# Altium footprint library THU VIEN PCB.PCBLib: 911 footprints (part 39 of 57)
Each footprint in its own frame and in the unit in brackets; x right, y up, seen from the top. Pads: shape width x height; smd on the part's side, far side on the other; paste and mask are expansions set on the pad; w line width, h text height; cw(c..) or ccw(c..) is an arc to the next point about the centre after c.
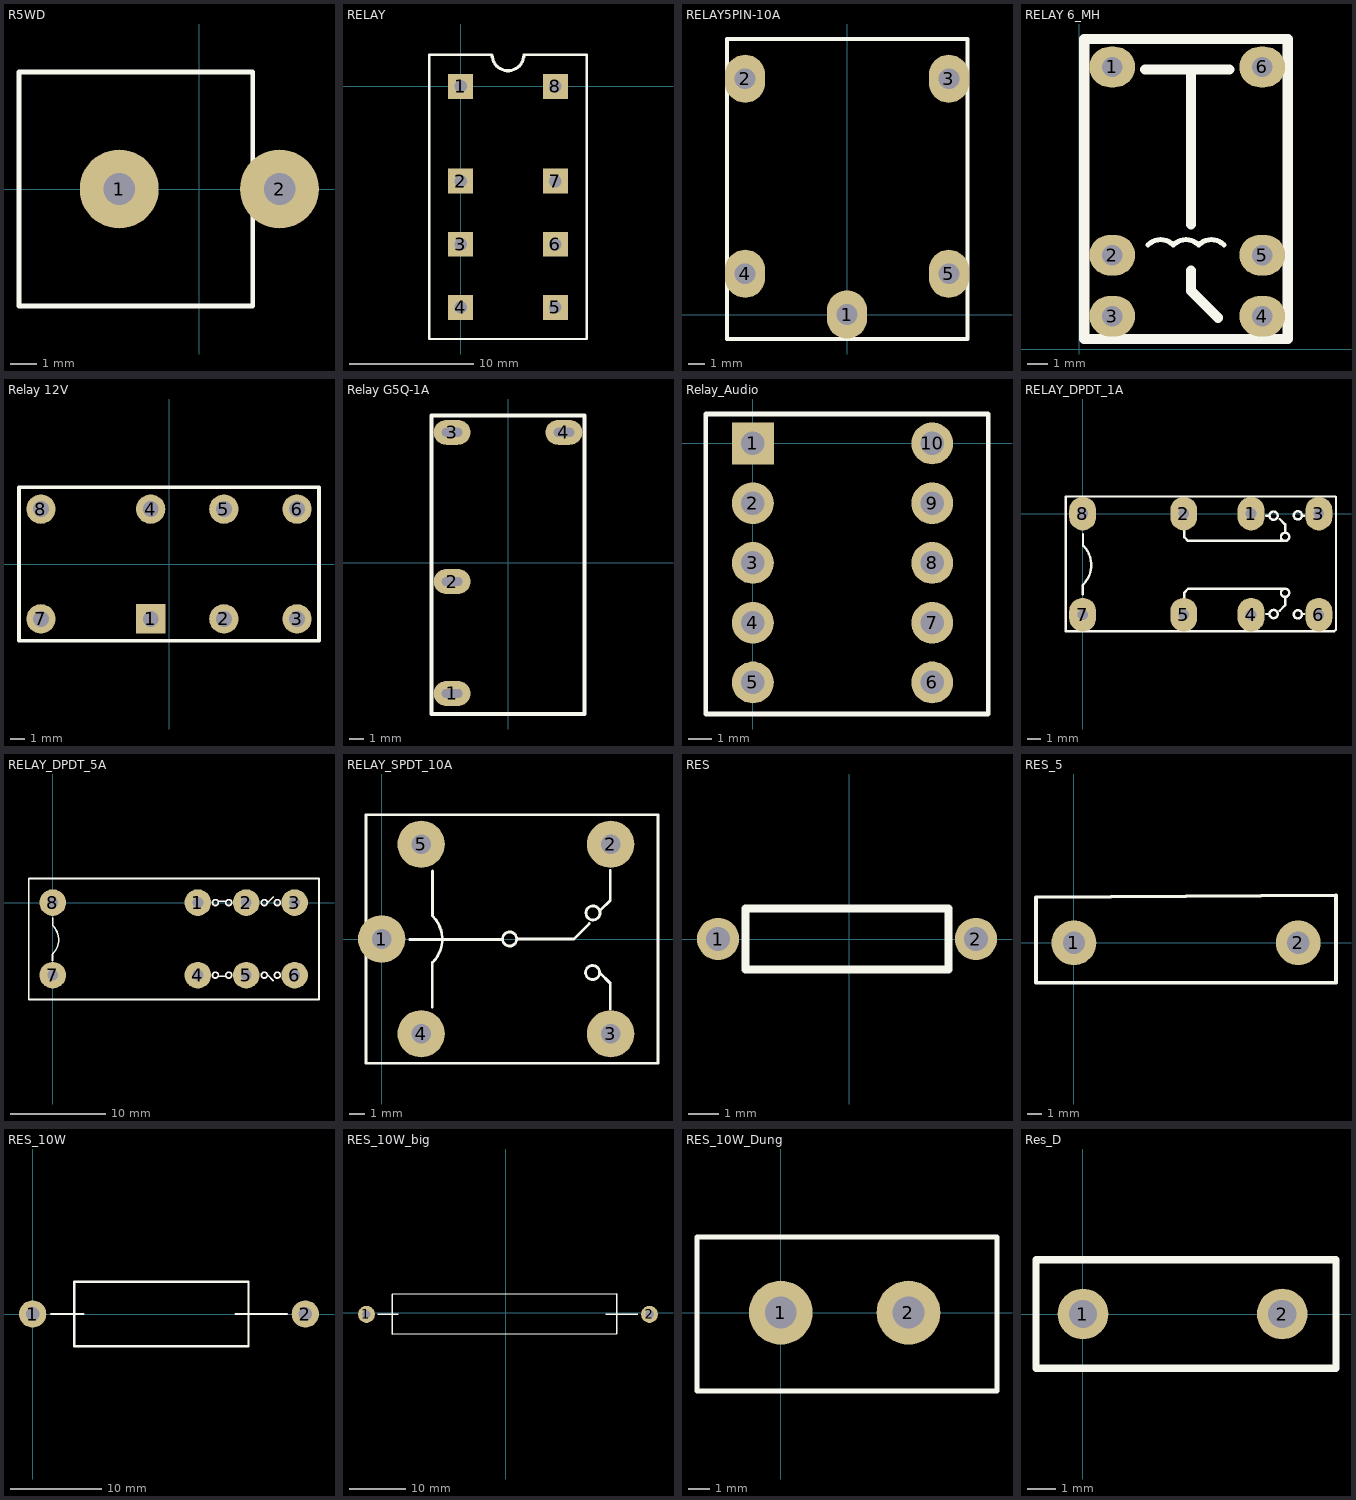
[diagram p38: the footprints below, top view; thin cyan lines are the x and y axes]

## R5WD [mm] "R5W , 2 pin, 300 x 600 mil"
height 10.16
pads (2):
  round 3 hole 1.2: 1(-3.048,0) 2(3.048,0)
Top Overlay:
  lines w0.178: -6.858,-4.445 -6.858,4.445 2.032,4.445 2.032,-4.445 -6.858,-4.445
3D body "SW3dPS-5W Res.STEP": height 23.05, standoff -2.4, extent -8.648,-5.08 4.432,4.92

## RELAY [mm]
pads (8):
  rect 2x2 hole 1: 1(0,0) 2(0,-7.62) 3(0,-12.7) 4(0,-17.78) 5(7.62,-17.78) 6(7.62,-12.7) 7(7.62,-7.62) 8(7.62,0)
Top Overlay:
  lines w0.2: 2.413,2.54 -2.54,2.54 -2.54,-20.32 10.16,-20.32 10.16,2.54 5.08,2.54
  lines w0.254: 2.534,2.54 ccw(c3.81,2.54) 5.086,2.54
3D body "SW3dPS-DSY2Y.STEP": height 12.3, standoff -3, extent -1.09,-19.29 8.71,1.51

## RELAY5PIN-10A [mm]
pads (5):
  oval 2.5x3 hole 1.3: 1(0,0) 2(-6.35,14.7) 3(6.35,14.7) 4(-6.35,2.54) 5(6.35,2.54)
Top Overlay:
  lines w0.254: -7.493,-1.524 -7.493,17.176 7.507,17.176 7.507,-1.524 -7.493,-1.524
3D body: height 16, standoff 0, extent -7.493,-1.524 7.493,17.145

## RELAY 6_MH [mil] "RELAY 6"
pads (6):
  oval 90x80 hole 40: 1(65,555) 2(65,185) 3(65,65) 4(360,65) 5(360,185) 6(360,555)
Top Overlay:
  lines w10: 135,205 cw(c160,180) 185,205 cw(c210,180) 235,205 cw(c260,180) 285,205
  lines w20: 130,550 295,550 ; 220,120 220,155 ; 220,245 220,550 ; 220.1,116 220.1,114.5 272.9,61.7 ; 10,20 10,610 410,610 410,20 10,20
3D body "Part1.stp": height 453.36, standoff 0.6, extent 10.08,22.69 403.78,613.24

## Relay 12V [mil] "RELAY"
pads (8):
  rect 80x80 hole 43.31: 1(-50,-150)
  round 80 hole 43.31: 2(150,-150) 3(350,-150) 4(-50,150) 5(150,150) 6(350,150) 7(-350,-150) 8(-350,150)
Top Overlay:
  lines w10: -410,-210 -410,210 410,210 410,-210 -410,-210

## Relay G5Q-1A [mm]
pads (4):
  oval 2.5x1.7 hole 0.6 slot 1.4 at 0 deg: 1(-3.81,-8.89) 2(-3.81,-1.27) 3(-3.81,8.89) 4(3.81,8.89)
Top Overlay:
  lines w0.254: -5.207,-10.287 -5.207,10.033 5.207,10.033 5.207,-10.287 -5.207,-10.287
3D body "Relay G5Q-1A.stp": height 16.21, standoff -3.39, extent -5.093,-10.267 5.207,10.033

## Relay_Audio [mil]
pads (10):
  rect 70x70 hole 39.37 unplated: 1(0,0)
  round 70 hole 39.37 unplated: 2(0,-100) 3(0,-200) 4(0,-300) 5(0,-400) 6(300,-400) 7(300,-300) 8(300,-200) 9(300,-100) 10(300,0)
Top Overlay:
  lines w7.87: -78.74,47.24 -78.74,-452.76 393.7,-452.76 393.7,47.24 ; -78.74,49.21 393.7,49.21

## RELAY_DPDT_1A [mil] "Reley DPDT, 8 pin, 1A, W400mil, L800mil,H 300mil"
height 300
pads (8):
  oval 80x100 hole 32: 1(500,0) 2(300,0) 3(701,0) 4(500,-300) 5(300,-300) 6(701,-300) 7(0,-300) 8(0,0)
Top Overlay:
  circle w7: c638.76,-5 r12.24
  circle w7: c566.76,-6 r12.24
  circle w7: c600.76,-69 r12.24
  circle w7: c600.76,-235 r12.24
  circle w7: c566.76,-298 r12.24
  circle w7: c638.76,-299 r12.24
  lines w7: 0,-239 0,-212 ; 1,-211 ccw(c-56.5,-152.5) 2,-95 ; 1,-94 1,-61 ; 302,-255 302,-234 313,-223 599,-223 ; 302,-42 302,-70 313,-81 599,-81 ; 544,-298 552,-298 ; 544,-6 552,-6 ; 585,-288 601,-272 601,-249 ; 585,-16 601,-32 601,-55 ; 653,-298 658,-298 ; 653,-6 658,-6 ; -50,-349 747,-349 752,-344 752,49 750,51 -50,51 -50,-349
3D body "SW3dPS-DSY2Y.STEP": height 484.25, standoff -118.11, extent -59.45,-340 759.45,45.83

## RELAY_DPDT_5A [mil] "Reley DPDT, 8 pin, 5A, W500mil, L1100mil,H 950mil"
height 300
pads (8):
  round 110 hole 45: 1(600,0) 2(800,0) 3(1000,0) 4(600,-300) 5(800,-300) 6(1000,-300) 7(0,-300) 8(0,0)
Top Overlay:
  circle w7: c928.76,0 r12.24
  circle w7: c874.76,0 r12.24
  circle w7: c727.76,0 r12.24
  circle w7: c672.76,0 r12.24
  circle w7: c672.76,-300 r12.24
  circle w7: c727.76,-300 r12.24
  circle w7: c874.76,-300 r12.24
  circle w7: c928.76,-300 r12.24
  lines w7: -1,-240 -1,-213 ; 0,-212 ccw(c-57.5,-153.5) 1,-96 ; 0,-95 0,-62 ; 687,-305 716,-305 ; 687,5 716,5 ; 888,-299 912,-323 ; 888,-1 912,23 ; -99,-401 -99,100 1101,100 1101,-401 -99,-401

## RELAY_SPDT_10A [mil] "Relay SPDT, 5 pin, 10A,W 650mil, L 800mil, H 800mil"
height 800
pads (5):
  round 120 hole 50: 1(0,0) 2(580,240) 3(580,-240) 4(100,-240) 5(100,240)
Top Overlay:
  circle w7: c534.2,-85 r17.8
  circle w7: c535.2,66 r17.8
  circle w7: c324.2,0 r17.8
  lines w7: 71,-1 304,-1 ; 128,-173 128,-60 ; 129,-59 ccw(c71.5,-0.5) 130,57 ; 129,58 129,172 ; 344,0 487,0 526,39 ; 552,-85 579,-112 579,-178 ; 553,72 579,98 579,174 ; -40,-315 -40,315 700,315 700,-315 -40,-315
3D body: height 472.44, standoff 0, extent -44.5,-318.5 702.5,318.5

## RES [mm]
pads (2):
  round 1.4 hole 0.8 unplated: 1(-4.356,0) 2(4.216,0)
Top Overlay:
  lines w0.254: -3.442,-1.016 -3.442,1.016 3.302,1.016 3.302,-1.016 -3.442,-1.016

## RES_5 [mm]
pads (2):
  round 3 hole 1.5 unplated: 1(0,0) 2(15,0)
Top Overlay:
  lines w0.254: -2.54,-2.667 -2.54,3.048 17.526,3.175 17.526,-2.667 -2.54,-2.667

## RES_10W [mm]
pads (2):
  round 3 hole 1.5 unplated: 1(0,0) 2(30,0)
Top Overlay:
  lines w0.254: 2.032,0 5.588,0 ; 22.352,0 27.94,0 ; 4.572,-3.556 23.749,-3.556 23.749,3.556 4.572,3.556 4.572,0 4.572,-3.556

## RES_10W_big [mm]
pads (2):
  round 3 hole 1.5 unplated: 1(-24.638,-0.254) 2(25.362,-0.254)
Top Overlay:
  lines w0.254: -22.606,-0.254 -19.05,-0.254 ; 17.653,-0.254 23.241,-0.254 ; -20.066,-3.81 -20.066,-0.254 -20.066,3.302 19.558,3.429 19.558,-3.683 -20.066,-3.81

## RES_10W_Dung [mm]
pads (2):
  round 3 hole 1.5 unplated: 1(0,0) 2(6,0)
Top Overlay:
  lines w0.254: -3.937,-3.683 10.16,-3.683 10.16,3.556 -3.937,3.556 -3.937,0 -3.937,-3.683

## Res_D [mil]
pads (2):
  round 70 hole 39.37 unplated: 1(0,0) 2(275.59,0)
Top Overlay:
  lines w10: -50,75 350,75 350,-75 -65,-75 -65,75 -35,75